# Altium footprint library ESKDPcbLib.PcbLib: 608 footprints (part 24 of 38)
Each footprint in its own frame and in the unit in brackets; x right, y up, seen from the top. Pads: shape width x height; smd on the part's side, far side on the other; paste and mask are expansions set on the pad; w line width, h text height; cw(c..) or ccw(c..) is an arc to the next point about the centre after c.
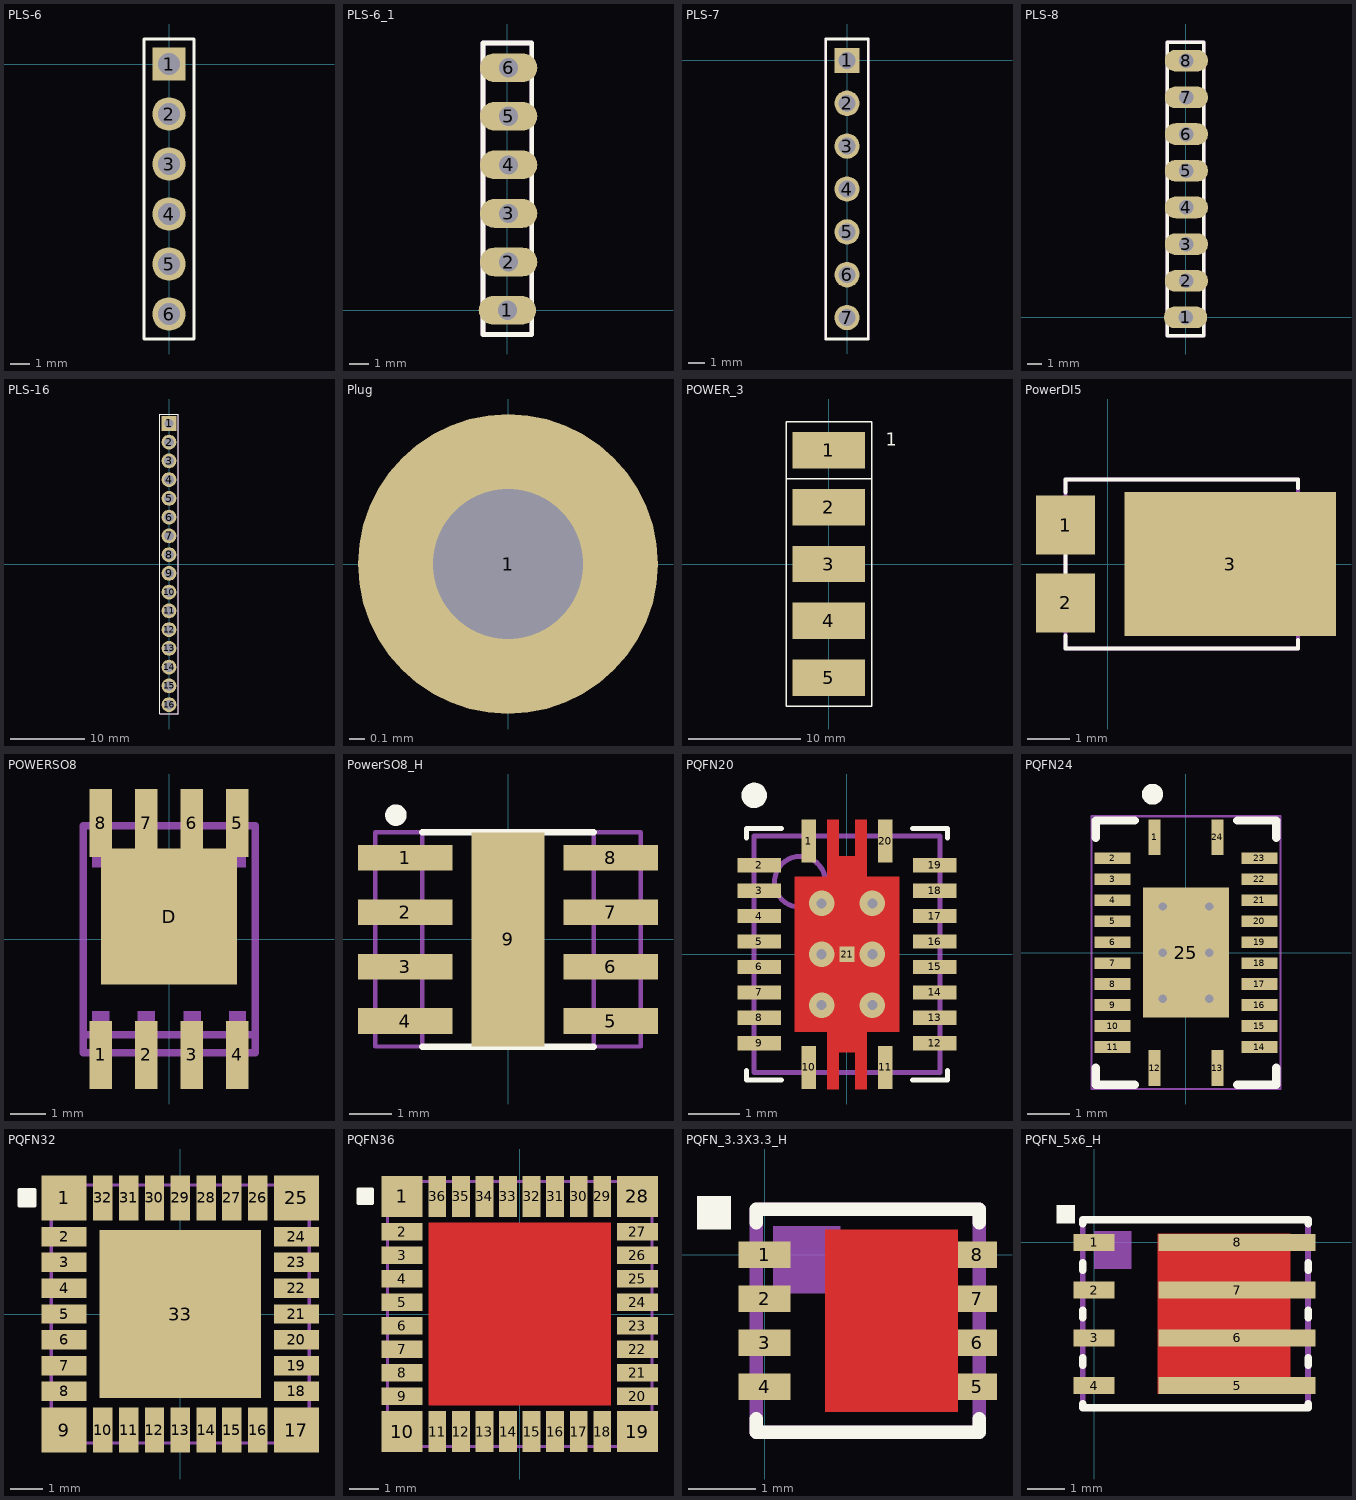
[diagram p23: the footprints below, top view; thin cyan lines are the x and y axes]

## PLS-6 [mm]
pads (6):
  rect 1.7x1.7 hole 1.1: 1(0,0)
  round 1.7 hole 1.1: 2(0,-2.54) 3(0,-5.08) 4(0,-7.62) 5(0,-10.16) 6(0,-12.7)
Top Overlay:
  lines w0.15: -1.27,-13.97 -1.27,1.27 1.27,1.27 1.27,-13.97 -1.27,-13.97
Mechanical 7:
  lines w0.1: -1.27,-13.97 -1.27,1.27 1.27,1.27 1.27,-13.97 -1.27,-13.97
3D body: height 8.8, standoff -3, extent -1.265,-13.975 1.275,1.265

## PLS-6_1 [mm]
pads (6):
  oval 3x1.5 hole 1: 1(0,0) 2(0.06,2.525) 3(0.06,5.065) 4(0.06,7.605) 5(0.06,10.145) 6(0.06,12.685)
Top Overlay:
  lines w0.254: -1.27,-1.27 -1.27,13.97 1.27,13.97 1.27,-1.27 -1.27,-1.27
Mechanical 7:
  lines w0.254: -1.27,-1.27 -1.27,13.97 1.27,13.97 1.27,-1.27 -1.27,-1.27
Mechanical 10:
  text ".Designator" at 2.5,13.16 h1
  text ".Comment" at 2.5,12.16 h1

## PLS-7 [mm]
pads (7):
  rect 1.5x1.5 hole 1: 1(0,0)
  round 1.5 hole 1: 2(0,-2.54) 3(0,-5.08) 4(0,-7.62) 5(0,-10.16) 6(0,-12.7) 7(0,-15.24)
Top Overlay:
  lines w0.15: -1.27,-16.51 -1.27,1.27 1.27,1.27 1.27,-16.51 -1.27,-16.51
Mechanical 7:
  lines w0.1: -1.27,-16.51 -1.27,1.27 1.27,1.27 1.27,-16.51 -1.27,-16.51

## PLS-8 [mm]
pads (8):
  oval 3x1.5 hole 1: 1(0,0) 2(0.06,2.525) 3(0.06,5.065) 4(0.06,7.605) 5(0.06,10.145) 6(0.06,12.685) 7(0.06,15.225) 8(0.06,17.765)
Top Overlay:
  lines w0.254: -1.27,-1.27 1.27,-1.27 1.27,19.05 -1.27,19.05 -1.27,-1.27
Mechanical 7:
  lines w0.254: -1.27,-1.27 1.27,-1.27 1.27,19.05 -1.27,19.05 -1.27,-1.27
Mechanical 10:
  text ".Comment" at 2.5,17.24 h1
  text ".Designator" at 2.5,18.24 h1

## PLS-16 [mm]
pads (16):
  rect 2x2 hole 1.2: 1(0,19.05)
  round 2 hole 1.3: 2(0,16.51) 3(0,13.97) 4(0,11.43) 5(0,8.89) 6(0,6.35) 7(0,3.81) 8(0,1.27) 9(0,-1.27) 10(0,-3.81) 11(0,-6.35) 12(0,-8.89) 13(0,-11.43) 14(0,-13.97) 15(0,-16.51) 16(0,-19.05)
Top Overlay:
  lines w0.15: -1.27,-20.32 -1.27,20.32 1.27,20.32 1.27,-20.32 -1.27,-20.32
Mechanical 7:
  lines w0.1: -1.27,-20.32 -1.27,20.32 1.27,20.32 1.27,-20.32 -1.27,-20.32
Mechanical 10:
  text ".Designator" at 2.54,17.78 h1.52
  text ".Comment" at 2.54,20.32 h1.52

## Plug [mm]
pads (1):
  round 2 hole 1 mask+0: 1(0,0)
3D body: height 30, standoff 0, extent -0.43,-0.24 0.43,0.24

## POWER_3 [mil]
pads (5):
  rect 254x128 smd: 1(0,400) 2(0,200) 3(0,0) 4(0,-200) 5(0,-400)
Top Overlay:
  lines w5: -150,300 -150,-500 150,-500 150,300 ; -150,300 150,300 ; -150,300 -150,500 150,500 150,300
  text "1" at 200,400 h77.5

## PowerDI5 [mm]
pads (3):
  rect 1.4x1.4 smd mask+0: 1(-1,0.92) 2(-1,-0.92)
  rect 5x3.4 smd mask+0: 3(2.9,0)
Top Overlay:
  lines w0.1: -1,-1.7 -1,-2 4.5,-2 4.5,-1.8 ; -1,-0.2 -1,0.2 ; -1,1.7 -1,2 4.5,2 4.5,1.8
Mechanical 7:
  lines w0.1: -1,-2 -1,2 4.5,2 4.5,-2 -1,-2
Mechanical 10:
  text ".Designator" at 1.83,3.13 h0.8
  text ".Comment" at 1.94,2.4 h0.6
3D body: height 1, standoff 0, extent -1,-2 4.5,2

## POWERSO8 [mm]
pads (9):
  rect 0.635x1.905 smd: 1(-1.905,-3.235) 2(-0.635,-3.235) 3(0.635,-3.235) 4(1.905,-3.235) 5(1.905,3.251) 6(0.635,3.251) 7(-0.635,3.251) 8(-1.905,3.251)
  rect 3.81x3.81 smd: D(0,0.635)
Mechanical 16:
  rectangle: -2.15,-3.1 -1.66,-2
  rectangle: -0.88,-3.1 -0.39,-2
  rectangle: 0.406,-3.1 0.889,-2
  rectangle: 1.676,-3.1 2.159,-2
  rectangle: 1.676,2.007 2.159,3.124
  rectangle: 0.406,2.007 0.889,3.124
  rectangle: -0.88,2.007 -0.39,3.124
  rectangle: -2.15,2.007 -1.66,3.124
  lines w0.203: -2.4,-2.67 -2.4,-3.17 2.413,-3.17 2.413,-2.67 ; -2.4,-2.67 -2.4,3.175 2.413,3.175 2.413,-2.67 ; -2.4,-2.67 2.413,-2.67

## PowerSO8_H [mm]
height 1.75
pads (9):
  rect 2.2x0.6 smd: 1(-2.4,1.905) 2(-2.4,0.635) 3(-2.4,-0.635) 4(-2.4,-1.905) 5(2.4,-1.905) 6(2.4,-0.635) 7(2.4,0.635) 8(2.4,1.905)
  rect 1.7x5 smd: 9(0,0)
Top Overlay:
  circle w0.25: c-2.615,2.9 r0.125
  lines w0.15: -2,-2.5 2,-2.5 ; -2,2.5 2,2.5
Mechanical 7:
  lines w0.1: -2,-2.5 -2,2.5 ; -0.5,2.5 ccw(c0,2.5) 0.5,2.5 ; 2,-2.5 2,2.5 ; -3.1,-2.5 3.1,-2.5 3.1,2.5 -3.1,2.5 -3.1,-2.5
Mechanical 10:
  text ".Comment" at -0.69,-3.25 h0.6
  text ".Designator" at -1,3.02 h0.8
3D body: height 1.7, standoff 0, extent -3,-2.54 3,2.54

## PQFN20 [mm] "QFN, 20-Leads, Body 4.5x3.5mm, Pitch 0.5mm, Thermal Pad 3.05x2.05mm, TI Recommended"
height 1
pads (21):
  rect 0.28x0.85 smd paste-0.025 mask+0.07: 1(-0.75,2.225) 10(-0.75,-2.225) 11(0.75,-2.225) 20(0.75,2.225)
  rect 0.85x0.28 smd paste-0.025 mask+0.07: 2(-1.725,1.75) 3(-1.725,1.25) 4(-1.725,0.75) 5(-1.725,0.25) 6(-1.725,-0.25) 7(-1.725,-0.75) 8(-1.725,-1.25) 9(-1.725,-1.75) 12(1.725,-1.75) 13(1.725,-1.25) 14(1.725,-0.75) 15(1.725,-0.25) 16(1.725,0.25) 17(1.725,0.75) 18(1.725,1.25) 19(1.725,1.75)
  rect 0.3x0.3 smd paste-0.15 mask+0: 21(0,0)
via 0.5,-1 diameter 0.5 hole 0.2
via 0.5,0 diameter 0.5 hole 0.2
via 0.5,1 diameter 0.5 hole 0.2
via -0.5,-1 diameter 0.5 hole 0.2
via -0.5,0 diameter 0.5 hole 0.2
via -0.5,1 diameter 0.5 hole 0.2
Top Layer:
  region: 0.16,2.65 0.16,1.925 -0.16,1.925 -0.16,2.65 -0.39,2.65 -0.39,1.525 -1.025,1.525 -1.025,-1.525 -0.39,-1.525 -0.39,-2.65 -0.16,-2.65 -0.16,-1.925 0.16,-1.925 0.16,-2.65 0.39,-2.65 0.39,-1.525 1.025,-1.525 1.025,1.525 0.39,1.525 0.39,2.65
Top Overlay:
  circle w0.25: c-1.825,3.125 r0.125
  lines w0.1: -1.975,-2.29 -1.975,-2.475 -1.29,-2.475 ; -1.975,2.29 -1.975,2.475 -1.29,2.475 ; 1.29,-2.475 1.975,-2.475 1.975,-2.29 ; 1.29,2.475 1.975,2.475 1.975,2.29
Top Paste:
  region: 0.15,1.47 0.15,0.15 0.97,0.15 0.97,1.47
  region: 0.97,-1.47 0.97,-0.15 0.15,-0.15 0.15,-1.47
  region: -0.15,-1.47 -0.15,-0.15 -0.97,-0.15 -0.97,-1.47
  region: -0.97,1.47 -0.97,0.15 -0.15,0.15 -0.15,1.47
  region: 0.39,-2.625 0.39,-1.725 0.16,-1.725 0.16,-2.625
  region: 0.16,2.625 0.16,1.725 0.39,1.725 0.39,2.625
  region: -0.16,-2.625 -0.16,-1.725 -0.39,-1.725 -0.39,-2.625
  region: -0.39,2.625 -0.39,1.725 -0.16,1.725 -0.16,2.625
Mechanical 7:
  lines w0.05: -1.825,-2.325 -1.825,2.325 1.825,2.325 1.825,-2.325 -1.825,-2.325
  lines w0.1: -0.5,0 0.5,0 ; 0,-0.5 0,0.5
Mechanical 9:
  circle w0.1: c-0.925,1.425 r0.5
  lines w0.1: -1.825,-2.325 -1.825,2.325 1.825,2.325 1.825,-2.325 -1.825,-2.325
Mechanical 10:
  text ".Comment" at -1.275,-3.35 h0.7
  text ".Designator" at -1.175,3.125 h0.7
3D body: height 1, standoff 0, extent -1.825,-2.325 1.825,2.325

## PQFN24 [mm] "3.5mm ? 5.5mm QFN-24 Pin"
height 1
pads (25):
  rect 0.28x0.85 smd: 1(-0.75,2.75) 12(-0.75,-2.75) 13(0.75,-2.75) 24(0.75,2.75)
  rect 0.85x0.28 smd: 2(-1.75,2.25) 3(-1.75,1.75) 4(-1.75,1.25) 5(-1.75,0.75) 6(-1.75,0.25) 7(-1.75,-0.25) 8(-1.75,-0.75) 9(-1.75,-1.25) 10(-1.75,-1.75) 11(-1.75,-2.25) 14(1.75,-2.25) 15(1.75,-1.75) 16(1.75,-1.25) 17(1.75,-0.75) 18(1.75,-0.25) 19(1.75,0.25) 20(1.75,0.75) 21(1.75,1.25) 22(1.75,1.75) 23(1.75,2.25)
  rect 2.05x3.1 smd: 25(0,0)
via -0.55,1.1 diameter 0.5 hole 0.2
via 0.55,1.1 diameter 0.5 hole 0.2
via -0.55,0 diameter 0.5 hole 0.2
via 0.55,0 diameter 0.5 hole 0.2
via -0.55,-1.1 diameter 0.5 hole 0.2
via 0.55,-1.1 diameter 0.5 hole 0.2
Top Overlay:
  circle w0.25: c-0.8,3.775 r0.125
  lines w0.2: -2.15,-2.74 -2.15,-3.15 -1.225,-3.15 ; -2.15,2.74 -2.15,3.15 -1.225,3.15 ; 1.225,-3.15 2.15,-3.15 2.15,-2.74 ; 1.225,3.15 2.15,3.15 2.15,2.74
Mechanical 14:
  lines w0.05: -2.25,-3.25 -2.25,3.25 2.25,3.25 2.25,-3.25 -2.25,-3.25
  lines w0.1: -0.5,0 0.5,0 ; 0,-0.5 0,0.5
3D body: height 1, standoff 0.05, extent -2.15,-3.15 2.15,3.15

## PQFN32 [mm]
pads (33):
  rect 1.4x1.4 smd mask+0: 1(-3.6,3.6) 9(-3.6,-3.6) 17(3.6,-3.6) 25(3.6,3.6)
  rect 1.4x0.6 smd mask+0: 2(-3.6,2.4) 3(-3.6,1.6) 4(-3.6,0.8) 5(-3.6,0) 6(-3.6,-0.8) 7(-3.6,-1.6) 8(-3.6,-2.4) 18(3.6,-2.4) 19(3.6,-1.6) 20(3.6,-0.8) 21(3.6,0) 22(3.6,0.8) 23(3.6,1.6) 24(3.6,2.4)
  rect 0.6x1.4 smd mask+0: 10(-2.4,-3.6) 11(-1.6,-3.6) 12(-0.8,-3.6) 13(0,-3.6) 14(0.8,-3.6) 15(1.6,-3.6) 16(2.4,-3.6) 26(2.4,3.6) 27(1.6,3.6) 28(0.8,3.6) 29(0,3.6) 30(-0.8,3.6) 31(-1.6,3.6) 32(-2.4,3.6)
  rect 5x5.2 smd mask+0: 33(0,0)
Top Overlay:
  rectangle: -5,3.35 -4.5,3.85
  lines w0.1: -5,3.35 -4.5,3.35 -4.5,3.85 -5,3.85 -5,3.35
Mechanical 7:
  rectangle: -4,3 -3,4
  lines w0.1: -4,3 -3,3 -3,4 ; -4,-4 4,-4 4,4 -4,4 -4,-4
Mechanical 10:
  text ".Designator" at -0.5,5 h0.8
  text ".Comment" at 1.5,-5.5 h0.6
3D body: height 2.2, standoff 0, extent -4,-4 4,4

## PQFN36 [mm]
pads (36):
  rect 1.4x1.4 smd mask+0: 1(-4,4) 10(-4,-4) 19(4,-4) 28(4,4)
  rect 1.4x0.6 smd mask+0: 2(-4,2.8) 3(-4,2) 4(-4,1.2) 5(-4,0.4) 6(-4,-0.4) 7(-4,-1.2) 8(-4,-2) 9(-4,-2.8) 20(4,-2.8) 21(4,-2) 22(4,-1.2) 23(4,-0.4) 24(4,0.4) 25(4,1.2) 26(4,2) 27(4,2.8)
  rect 0.6x1.4 smd mask+0: 11(-2.8,-4) 12(-2,-4) 13(-1.2,-4) 14(-0.4,-4) 15(0.4,-4) 16(1.2,-4) 17(2,-4) 18(2.8,-4) 29(2.8,4) 30(2,4) 31(1.2,4) 32(0.4,4) 33(-0.4,4) 34(-1.2,4) 35(-2,4) 36(-2.8,4)
Top Layer:
  region: -3.1,3.1 3.1,3.1 3.1,-3.1 -3.1,-3.1
Top Overlay:
  rectangle: -5.5,3.75 -5,4.25
  lines w0.1: -5.5,3.75 -5.5,4.25 -5,4.25 -5,3.75 -5.5,3.75
Mechanical 7:
  rectangle: -4.5,3.5 -3.5,4.5
  lines w0.1: -4.5,3.5 -3.5,3.5 -3.5,4.5 ; -4.5,-4.5 -4.5,4.5 4.5,4.5 4.5,-4.5 -4.5,-4.5
Mechanical 10:
  text ".Comment" at 1.5,-5.5 h0.6
  text ".Designator" at -0.5,5 h0.8
3D body: height 2.2, standoff 0, extent -4.5,-4.5 4.5,4.5

## PQFN_3.3X3.3_H [mm]
height 1
pads (8):
  rect 0.77x0.39 smd: 1(0,0) 2(0,-0.65) 3(0,-1.3) 4(0,-1.95)
  rect 0.58x0.39 smd: 5(3.15,-1.95) 6(3.15,-1.3) 7(3.15,-0.65) 8(3.15,0)
Top Layer:
  region: 0.9,0.375 0.9,-2.325 2.86,-2.325 2.86,0.375
Top Overlay:
  rectangle: -1,0.375 -0.5,0.875
  lines w0.2: -0.125,-2.425 -0.125,-2.625 3.175,-2.625 3.175,-2.425 ; -0.125,0.475 -0.125,0.675 3.175,0.675 3.175,0.475
Mechanical 7:
  rectangle: 0.125,-0.575 1.125,0.425
  lines w0.2: -0.125,-2.625 -0.125,0.675 3.175,0.675 3.175,-2.625 -0.125,-2.625
Mechanical 10:
  text ".Comment" at 1,-3.25 h0.6
  text ".Designator" at 0.25,1 h0.8
3D body: height 1, standoff 0, extent -0.125,-2.625 3.175,0.675

## PQFN_5x6_H [mm]
pads (8):
  rect 1.08x0.45 smd: 1(0,0) 2(0,-1.27) 3(0,-2.54) 4(0,-3.81)
  rect 4.18x0.45 smd: 5(3.81,-3.81) 6(3.81,-2.54) 7(3.81,-1.27) 8(3.81,0)
Top Layer:
  region: 1.7,0.23 1.7,-4.03 5.23,-4.03 5.23,0.23
Top Overlay:
  rectangle: -1,0.5 -0.5,1
  lines w0.2: -0.3,-4.3 -0.3,-4.4 5.7,-4.4 5.7,-4.3 ; -0.3,-3.275 -0.3,-3.075 ; -0.3,-2.005 -0.3,-1.805 ; -0.3,-0.735 -0.3,-0.535 ; -0.3,0.5 -0.3,0.6 5.7,0.6 5.7,0.5 ; 5.7,-3.275 5.7,-3.075 ; 5.7,-2.005 5.7,-1.805 ; 5.7,-0.735 5.7,-0.535
Mechanical 7:
  rectangle: 0,-0.7 1,0.3
  lines w0.15: -0.3,-4.4 -0.3,0.6 5.7,0.6 5.7,-4.4 -0.3,-4.4
Mechanical 10:
  text ".Designator" at 2.52,0.85 h0.8
  text ".Comment" at 2.52,-5.01 h0.6
3D body: height 0.9, standoff 0, extent -0.3,-4.4 5.7,0.6